# Altium footprint library STM32F0.PcbLib: 228 footprints (part 6 of 16)
Each footprint in its own frame and in the unit in brackets; x right, y up, seen from the top. Pads: shape width x height; smd on the part's side, far side on the other; paste and mask are expansions set on the pad; w line width, h text height; cw(c..) or ccw(c..) is an arc to the next point about the centre after c.
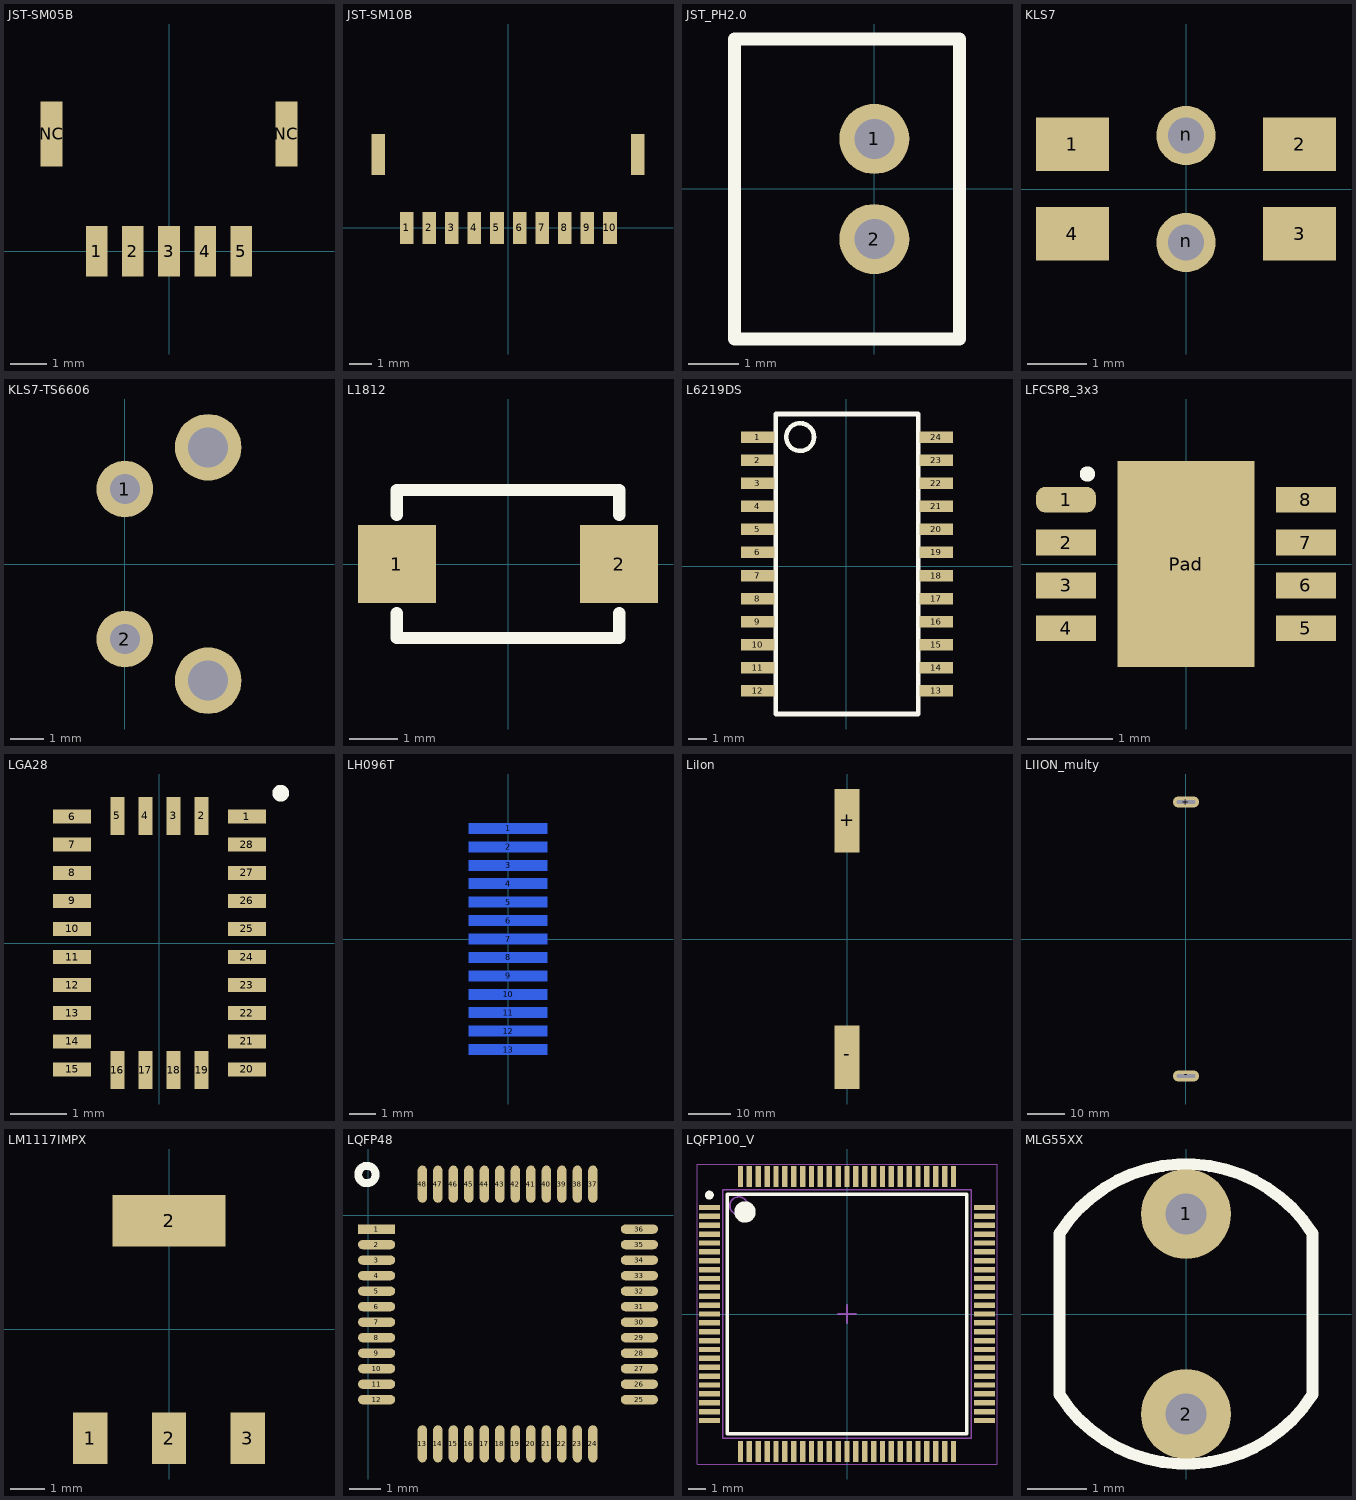
[diagram p5: the footprints below, top view; thin cyan lines are the x and y axes]

## JST-SM05B [mm]
pads (7):
  rect 0.6x1.4 smd: 1(-2,0) 2(-1,0) 3(0,0) 4(1,0) 5(2,0)
  rect 0.6x1.8 smd: NC(-3.25,3.25) NC(3.25,3.25)
3D body "User Library-JST - SM05B-SRSS-TB (SH SERIES - 1_0mm PITCH WIRE-TO-BOARD, SMT, RA).step": height 2.9, standoff 0, extent -3.5,-0.382 3.5,4.567

## JST-SM10B [mm]
pads (12):
  rect 0.6x1.4 smd: 1(-4.5,0) 2(-3.5,0) 3(-2.5,0) 4(-1.5,0) 5(-0.5,0) 6(0.5,0) 7(1.5,0) 8(2.5,0) 9(3.5,0) 10(4.5,0)
  rect 0.6x1.8 smd: ""(-5.75,3.25) ""(5.725,3.25)
3D body "SH10_1.stp": height 2.9, standoff 0, extent -6,-0.7 6,4.25

## JST_PH2.0 [mm]
pads (2):
  round 1.4 hole 0.8: 1(0,1) 2(0,-1)
Top Overlay:
  lines w0.254: -2.794,-2.997 -2.794,2.997 1.702,2.997 1.702,-2.997 -2.794,-2.997
3D body "User Library-PCB HEADER (JST BxB-PH-K-S (VERTICAL)).step": height 6, standoff -1.91, extent -2.8,-3 1.7,3

## KLS7 [mm]
pads (6):
  rect 1.225x0.9 smd: 1(-1.913,0.75) 2(1.913,0.75) 3(1.913,-0.75) 4(-1.913,-0.75)
  round 1 hole 0.6: n(0,-0.9) n(0,0.9)
3D body "User Library-KLS7-TS5401.step": height 1.35, standoff -0.5, extent -2.25,-2.15 2.25,1.5

## KLS7-TS6606 [mm]
pads (4):
  round 1.7 hole 0.9: 1(0,2.25) 2(0,-2.25)
  round 2 hole 1.2: ""(2.5,-3.5) ""(2.5,3.5)
3D body "skhhlv.stp": height 8.4, standoff -2.5, extent -5.89,-4.25 4.01,4.25

## L1812 [mm]
pads (2):
  rect 1.6x1.6 smd: 1(-2.286,0) 2(2.286,0)
Top Overlay:
  lines w0.254: -2.286,-1.016 -2.286,-1.524 2.286,-1.524 2.286,-1.016 ; -2.286,1.016 -2.286,1.524 2.286,1.524 2.286,1.016
3D body "User Library-L_SMD.step": height 0, standoff -3.2, extent -2.25,-1.6 2.25,1.6

## L6219DS [mm]
pads (24):
  rect 1.83x0.63 smd: 1(-4.87,7.112) 2(-4.87,5.842) 3(-4.87,4.572) 4(-4.87,3.302) 5(-4.87,2.032) 6(-4.87,0.762) 7(-4.87,-0.508) 8(-4.87,-1.778) 9(-4.87,-3.048) 10(-4.87,-4.318) 11(-4.87,-5.588) 12(-4.87,-6.858) 13(4.95,-6.858) 14(4.95,-5.588) 15(4.95,-4.318) 16(4.95,-3.048) 17(4.95,-1.778) 18(4.95,-0.508) 19(4.95,0.762) 20(4.95,2.032) 21(4.95,3.302) 22(4.95,4.572) 23(4.95,5.842) 24(4.95,7.112)
Top Overlay:
  circle w0.254: c-2.54,7.112 r0.762
  lines w0.254: -3.888,-8.128 -3.888,8.382 3.968,8.382 3.968,-8.128 -3.888,-8.128
3D body "User Library-SO-24W.STEP": height 2.48, standoff 0, extent -5.207,-7.536 5.103,7.874

## LFCSP8_3x3 [mm]
pads (9):
  rrect75% 0.7x0.3 smd: 1(-1.4,0.75)
  rect 0.7x0.3 smd: 2(-1.4,0.25) 3(-1.4,-0.25) 4(-1.4,-0.75) 5(1.4,-0.75) 6(1.4,-0.25) 7(1.4,0.25) 8(1.4,0.75)
  rect 1.6x2.4 smd: Pad(0,0)
Top Overlay:
  circle w0.15: c-1.15,1.05 r0.014
3D body "User Library-LFCSP-8_CP-8-11.step": height 0.8, standoff 0, extent -1.51,-1.5 1.51,1.5

## LGA28 [mm]
pads (28):
  rect 0.675x0.25 smd: 1(1.557,2.25) 6(-1.557,2.25) 7(-1.557,1.75) 8(-1.557,1.25) 9(-1.557,0.75) 10(-1.557,0.25) 11(-1.557,-0.25) 12(-1.557,-0.75) 13(-1.557,-1.25) 14(-1.557,-1.75) 15(-1.557,-2.25) 20(1.557,-2.25) 21(1.557,-1.75) 22(1.557,-1.25) 23(1.557,-0.75) 24(1.557,-0.25) 25(1.557,0.25) 26(1.557,0.75) 27(1.557,1.25) 28(1.557,1.75)
  rect 0.25x0.675 smd: 2(0.75,2.262) 3(0.25,2.262) 4(-0.25,2.262) 5(-0.75,2.262) 16(-0.75,-2.262) 17(-0.25,-2.262) 18(0.25,-2.262) 19(0.75,-2.262)
Top Overlay:
  circle w0.15: c2.159,2.667 r0.075
3D body "User Library-LGA-28_5_2x3_8_0_5p.step": height 1.18, standoff 0, extent -1.9,-2.6 1.9,2.6

## LH096T [mm]
pads (13):
  rect 3x0.4 smd far side: 1(0,4.2) 2(0,3.5) 3(0,2.8) 4(0,2.1) 5(0,1.4) 6(0,0.7) 7(0,0) 8(0,-0.7) 9(0,-1.4) 10(0,-2.1) 11(0,-2.8) 12(0,-3.5) 13(0,-4.2)
3D body "0.96IPSDisplay.step": height 1.5, standoff -1.15, extent -16.511,-6.76 12.439,6.74

## LiIon [mm]
pads (2):
  rect 6x15 smd: +(0,28) -(0,-28)
3D body "LiIon21700.stp": height 22, standoff 0, extent -10.5,-35.375 10.5,35.625

## LIION_multy [mm]
pads (2):
  oval 7x3 hole 1 slot 5 at 0 deg: +(0,36.775) -(0,-36.775)
3D body "LiIon21700.stp": height 22, standoff 0, extent -10.5,-35.375 10.5,35.625

## LM1117IMPX [mm]
pads (4):
  rect 1x1.5 smd: 1(-2.3,-3.175) 2(0,-3.175) 3(2.3,-3.175)
  rect 3.3x1.5 smd: 2(0,3.175)
3D body "User Library-SOT223-3.step": height 1.7, standoff 0, extent -3.25,-3.5 3.25,3.5

## LQFP48 [mm]
pads (48):
  rect 1.2x0.3 smd: 1(0.275,-0.45)
  oval 1.2x0.3 smd: 2(0.275,-0.95) 3(0.275,-1.45) 4(0.275,-1.95) 5(0.275,-2.45) 6(0.275,-2.95) 7(0.275,-3.45) 8(0.275,-3.95) 9(0.275,-4.45) 10(0.275,-4.95) 11(0.275,-5.45) 12(0.275,-5.95) 25(8.75,-5.95) 26(8.75,-5.45) 27(8.75,-4.95) 28(8.75,-4.45) 29(8.75,-3.95) 30(8.75,-3.45) 31(8.75,-2.95) 32(8.75,-2.45) 33(8.75,-1.95) 34(8.75,-1.45) 35(8.75,-0.95) 36(8.75,-0.45)
  oval 0.3x1.2 smd: 13(1.75,-7.375) 14(2.25,-7.375) 15(2.75,-7.375) 16(3.25,-7.375) 17(3.75,-7.375) 18(4.25,-7.375) 19(4.75,-7.375) 20(5.25,-7.375) 21(5.75,-7.375) 22(6.25,-7.375) 23(6.75,-7.375) 24(7.25,-7.375) 37(7.25,1) 38(6.75,1) 39(6.25,1) 40(5.75,1) 41(5.25,1) 42(4.75,1) 43(4.25,1) 44(3.75,1) 45(3.25,1) 46(2.75,1) 47(2.25,1) 48(1.75,1)
Top Overlay:
  circle w0.254: c-0.037,1.31 r0.281
3D body "User Library-LQFP48_Grid_0_5.STEP": height 1.6, standoff 0, extent 0,-7.691 9,1.309

## LQFP100_V [mm] "Thin QFP, 100-Leads, Body 14x14mm, Pitch 0.5mm, ST Recommended"
height 1.6
pads (100):
  rect 1.2x0.3 smd: 1(-7.75,6) 2(-7.75,5.5) 3(-7.75,5) 4(-7.75,4.5) 5(-7.75,4) 6(-7.75,3.5) 7(-7.75,3) 8(-7.75,2.5) 9(-7.75,2) 10(-7.75,1.5) 11(-7.75,1) 12(-7.75,0.5) 13(-7.75,0) 14(-7.75,-0.5) 15(-7.75,-1) 16(-7.75,-1.5) 17(-7.75,-2) 18(-7.75,-2.5) 19(-7.75,-3) 20(-7.75,-3.5) 21(-7.75,-4) 22(-7.75,-4.5) 23(-7.75,-5) 24(-7.75,-5.5) 25(-7.75,-6) 51(7.75,-6) 52(7.75,-5.5) 53(7.75,-5) 54(7.75,-4.5) 55(7.75,-4) 56(7.75,-3.5) 57(7.75,-3) 58(7.75,-2.5) 59(7.75,-2) 60(7.75,-1.5) 61(7.75,-1) 62(7.75,-0.5) 63(7.75,0) 64(7.75,0.5) 65(7.75,1) 66(7.75,1.5) 67(7.75,2) 68(7.75,2.5) 69(7.75,3) 70(7.75,3.5) 71(7.75,4) 72(7.75,4.5) 73(7.75,5) 74(7.75,5.5) 75(7.75,6)
  rect 0.3x1.2 smd: 26(-6,-7.75) 27(-5.5,-7.75) 28(-5,-7.75) 29(-4.5,-7.75) 30(-4,-7.75) 31(-3.5,-7.75) 32(-3,-7.75) 33(-2.5,-7.75) 34(-2,-7.75) 35(-1.5,-7.75) 36(-1,-7.75) 37(-0.5,-7.75) 38(0,-7.75) 39(0.5,-7.75) 40(1,-7.75) 41(1.5,-7.75) 42(2,-7.75) 43(2.5,-7.75) 44(3,-7.75) 45(3.5,-7.75) 46(4,-7.75) 47(4.5,-7.75) 48(5,-7.75) 49(5.5,-7.75) 50(6,-7.75) 76(6,7.75) 77(5.5,7.75) 78(5,7.75) 79(4.5,7.75) 80(4,7.75) 81(3.5,7.75) 82(3,7.75) 83(2.5,7.75) 84(2,7.75) 85(1.5,7.75) 86(1,7.75) 87(0.5,7.75) 88(0,7.75) 89(-0.5,7.75) 90(-1,7.75) 91(-1.5,7.75) 92(-2,7.75) 93(-2.5,7.75) 94(-3,7.75) 95(-3.5,7.75) 96(-4,7.75) 97(-4.5,7.75) 98(-5,7.75) 99(-5.5,7.75) 100(-6,7.75)
Top Overlay:
  circle w0.25: c-7.75,6.7 r0.125
  circle w0.6: c-5.75,5.75 r0.3
  lines w0.2: -6.75,-6.75 -6.75,6.75 6.75,6.75 6.75,-6.75 -6.75,-6.75
Mechanical 13:
  circle w0.1: c-6.1,6.1 r0.5
  lines w0.1: -7,-7 -7,7 7,7 7,-7 -7,-7
Mechanical 15:
  lines w0.05: -8.45,-8.45 -8.45,8.45 8.45,8.45 8.45,-8.45 -8.45,-8.45
  lines w0.1: -0.5,0 0.5,0 ; 0,-0.5 0,0.5
3D body "User Library-LQFP100-3.STEP": height 1.62, standoff -0.01, extent -8.062,-8.085 8.082,8.058

## MLG55XX [mm]
pads (2):
  round 1.524 hole 0.7: 1(0,1.7) 2(0,-1.7)
Top Overlay:
  lines w0.2: -2.15,-1.37 ccw(c0,0) 2.15,-1.37 2.15,1.37 ccw(c0,0) -2.15,1.37 -2.15,-1.37
3D body: height 2, standoff 1.8, extent -0.35,1.35 0.35,2.05
3D body: height 2, standoff 1.8, extent -0.35,-2.05 0.35,-1.35
3D body: height 1.8, standoff 0, extent -2.15,-2.56 2.15,2.56